# Altium footprint library HW_HOLLAND_NCDM_MONITOR_R1.PcbLib: 472 footprints (part 18 of 30)
Each footprint in its own frame and in the unit in brackets; x right, y up, seen from the top. Pads: shape width x height; smd on the part's side, far side on the other; paste and mask are expansions set on the pad; w line width, h text height; cw(c..) or ccw(c..) is an arc to the next point about the centre after c.
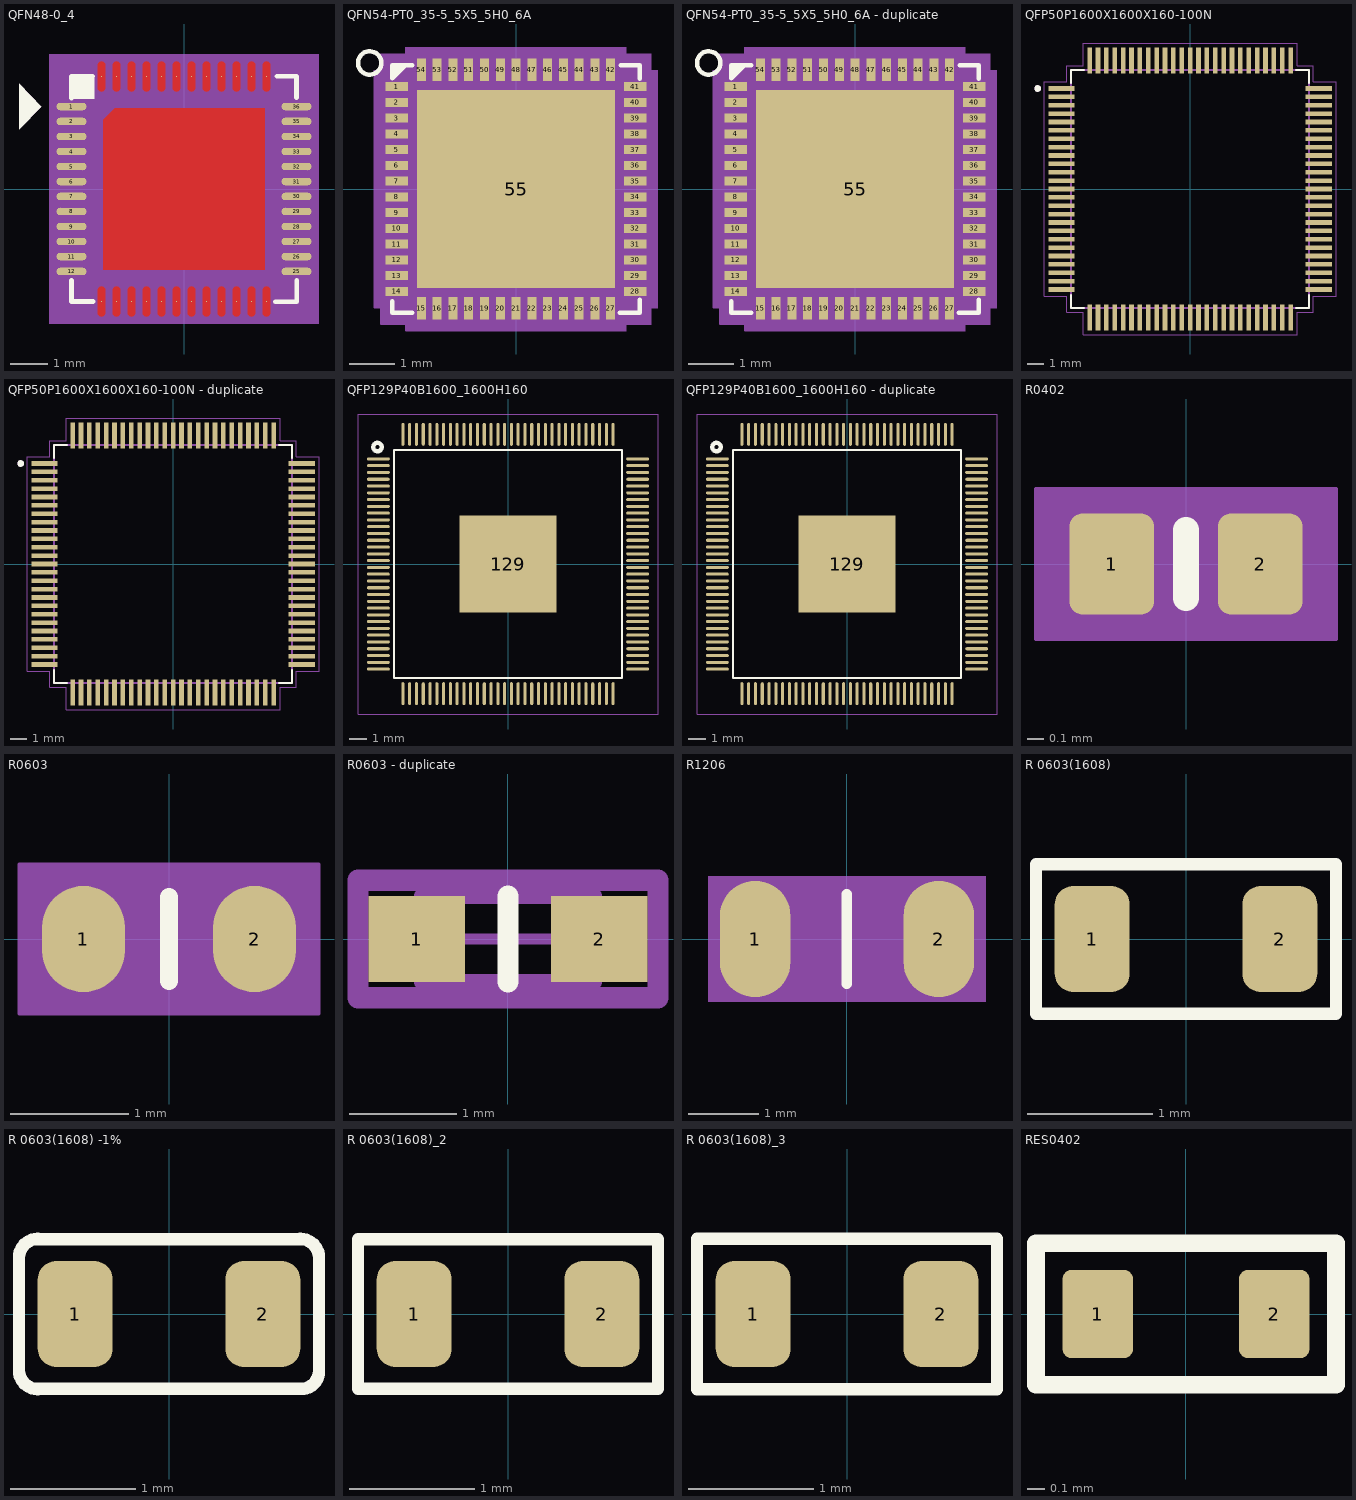
[diagram p17: the footprints below, top view; thin cyan lines are the x and y axes]

## QFN48-0_4 [mil]
pads (49):
  oval 31.5x7.87 smd: 1(-118.11,86.61) 2(-118.11,70.87) 3(-118.11,55.12) 4(-118.11,39.37) 5(-118.11,23.62) 6(-118.11,7.87) 7(-118.11,-7.87) 8(-118.11,-23.62) 9(-118.11,-39.37) 10(-118.11,-55.12) 11(-118.11,-70.87) 12(-118.11,-86.61) 25(118.11,-86.61) 26(118.11,-70.87) 27(118.11,-55.12) 28(118.11,-39.37) 29(118.11,-23.62) 30(118.11,-7.87) 31(118.11,7.87) 32(118.11,23.62) 33(118.11,39.37) 34(118.11,55.12) 35(118.11,70.87) 36(118.11,86.61)
  oct 1x1 smd: 13(-86.61,-118.11) 14(-70.87,-118.11) 15(-55.12,-118.11) 16(-39.37,-118.11) 17(-23.62,-118.11) 18(-7.87,-118.11) 19(7.87,-118.11) 20(23.62,-118.11) 21(39.37,-118.11) 22(55.12,-118.11) 23(70.87,-118.11) 24(86.61,-118.11) 37(86.61,118.11) 38(70.87,118.11) 39(55.12,118.11) 40(39.37,118.11) 41(23.62,118.11) 42(7.87,118.11) 43(-7.87,118.11) 44(-23.62,118.11) 45(-39.37,118.11) 46(-55.12,118.11) 47(-70.87,118.11) 48(-86.61,118.11) 49(-3.94,-3.94)
Top Layer:
  drawing of 26 lines, arcs and shapes, not listed
Top Overlay:
  dashed: -149.61,86.61 -173.23,62.99 -173.23,110.24
  dashed: -118.11,118.11 -118.11,94.49 -94.49,94.49 -94.49,118.11
  lines w4.92: -118.11,-95.67 -118.11,-118.11 -95.28,-118.11 ; -118.11,95.28 -118.11,118.5 ; -117.32,118.5 -96.06,118.5 ; 95.67,-118.5 118.5,-118.5 118.5,-95.67 ; 97.64,118.5 117.72,118.5 ; 118.11,95.67 118.11,118.11
Top Paste:
  drawing of 30 lines, arcs and shapes, not listed
Top Solder:
  drawing of 26 lines, arcs and shapes, not listed
Top Assembly:
  dashed: -149.61,86.61 -173.23,62.99 -173.23,110.24
  dashed: -118.11,118.11 -118.11,94.49 -94.49,94.49 -94.49,118.11
  lines w1: -118.11,-118.11 118.11,-118.11 118.11,118.11 -118.11,118.11 -118.11,-118.11
  text ".Designator" at -37.51,-8.33 h25
Top 3D Body:
  region: 141.73,141.73 141.73,-141.73 -141.73,-141.73 -141.73,141.73
Mechanical 17:
  text "34" at 118.11,83.92 h18
  text "14" at -70.87,-103.71 h18
  text "15" at -55.12,-103.71 h18
  text "13" at -86.61,-103.71 h18
  text "33" at 118.11,68.17 h18
  text "43" at -7.87,132.51 h18
  text "44" at -23.62,132.51 h18
  text "39" at 55.12,132.51 h18
  text "38" at 70.87,132.51 h18
  text "41" at 23.62,132.51 h18
  text "40" at 39.37,132.51 h18
  text "42" at 7.87,132.51 h18
  text "46" at -55.12,132.51 h18
  text "16" at -39.37,-103.71 h18
  text "26" at 118.11,-42.07 h18
  text "17" at -23.62,-103.71 h18
  text "28" at 118.11,-10.57 h18
  text "25" at 118.11,-57.81 h18
  text "32" at 118.11,52.42 h18
  text "19" at 7.87,-103.71 h18
  text "11" at -118.11,-42.07 h18
  text "10" at -118.11,-26.32 h18
  text "8" at -118.11,-9.22 h18
  text "7" at -118.11,6.53 h18
  text "6" at -118.11,22.27 h18
  text "5" at -118.11,38.02 h18
  text "3" at -118.11,69.52 h18
  text "2" at -118.11,85.27 h18
  text "27" at 118.11,-26.32 h18
  text "20" at 23.62,-103.71 h18
  text "29" at 118.11,5.18 h18
  text "4" at -118.11,53.77 h18
  text "9" at -118.11,-24.97 h18
  text "47" at -70.87,132.51 h18
  text "22" at 55.12,-103.71 h18
  text "12" at -118.11,-57.81 h18
  text "1" at -118.11,101.01 h18
  text "31" at 118.11,36.67 h18
  text "30" at 118.11,20.93 h18
  text "35" at 118.11,99.67 h18
  text "37" at 86.61,132.51 h18
  text "36" at 118.11,101.01 h18
  text "21" at 39.37,-103.71 h18
  text "24" at 86.61,-103.71 h18
  text "45" at -39.37,132.51 h18
  text "48" at -86.61,132.51 h18
  text "18" at -7.87,-103.71 h18
  text "23" at 70.87,-103.71 h18
  text "49" at -3.94,24.86 h18
3D body: height 150, standoff 0, extent -141.73,-141.73 141.73,141.73

## QFN54-PT0_35-5_5X5_5H0_6A [mm]
pads (55):
  rect 0.5x0.2 smd: 1(-2.65,2.275) 2(-2.65,1.925) 3(-2.65,1.575) 4(-2.65,1.225) 5(-2.65,0.875) 6(-2.65,0.525) 7(-2.65,0.175) 8(-2.65,-0.175) 9(-2.65,-0.525) 10(-2.65,-0.875) 11(-2.65,-1.225) 12(-2.65,-1.575) 13(-2.65,-1.925) 14(-2.65,-2.275) 28(2.65,-2.275) 29(2.65,-1.925) 30(2.65,-1.575) 31(2.65,-1.225) 32(2.65,-0.875) 33(2.65,-0.525) 34(2.65,-0.175) 35(2.65,0.175) 36(2.65,0.525) 37(2.65,0.875) 38(2.65,1.225) 39(2.65,1.575) 40(2.65,1.925) 41(2.65,2.275)
  rect 0.2x0.5 smd: 15(-2.1,-2.65) 16(-1.75,-2.65) 17(-1.4,-2.65) 18(-1.05,-2.65) 19(-0.7,-2.65) 20(-0.35,-2.65) 21(0,-2.65) 22(0.35,-2.65) 23(0.7,-2.65) 24(1.05,-2.65) 25(1.4,-2.65) 26(1.75,-2.65) 27(2.1,-2.65) 42(2.1,2.65) 43(1.75,2.65) 44(1.4,2.65) 45(1.05,2.65) 46(0.7,2.65) 47(0.35,2.65) 48(0,2.65) 49(-0.35,2.65) 50(-0.7,2.65) 51(-1.05,2.65) 52(-1.4,2.65) 53(-1.75,2.65) 54(-2.1,2.65)
  rect 4.4x4.4 smd: 55(0,0)
Top Overlay:
  circle w0.1: c-3.25,2.8 r0.26
  lines w0.1: -2.75,-2.49 -2.75,-2.75 -2.3,-2.75 ; -2.733,2.606 -2.603,2.737 ; -2.46,2.75 -2.75,2.46 -2.75,2.75 -2.3,2.75 ; 2.3,-2.75 2.75,-2.75 2.75,-2.46 ; 2.33,2.75 2.75,2.75 2.75,2.45
Top Assembly:
  lines w0.025: -2.9,-2.38 -2.75,-2.38 -2.75,-2.75 -2.2,-2.75 -2.2,-2.9 2.2,-2.9 2.2,-2.75 2.75,-2.75 2.75,-2.38 2.9,-2.38 2.9,2.38 2.75,2.38 2.75,2.75 2.2,2.75 2.2,2.9 -2.2,2.9 -2.2,2.75 -2.75,2.75 -2.75,2.38 -2.9,2.38 -2.9,-2.38
  text ".Designator" at -2.2,-0.2 h0.6
Mechanical 19:
  text "1" at -2.244,2.275 h0.51
  text "2" at -2.244,1.925 h0.51
  text "53" at -0.937,2.65 h0.51
  text "42" at 2.913,2.65 h0.51
  text "52" at -0.587,2.65 h0.51
  text "51" at -0.237,2.65 h0.51
  text "50" at 0.113,2.65 h0.51
  text "49" at 0.463,2.65 h0.51
  text "46" at 1.513,2.65 h0.51
  text "45" at 1.863,2.65 h0.51
  text "44" at 2.213,2.65 h0.51
  text "43" at 2.563,2.65 h0.51
  text "54" at -1.287,2.65 h0.51
  text "20" at 0.463,-2.65 h0.51
  text "55" at 0.813,0 h0.51
  text "27" at 2.913,-2.65 h0.51
  text "10" at -1.837,-0.875 h0.51
  text "18" at -0.237,-2.65 h0.51
  text "25" at 2.213,-2.65 h0.51
  text "32" at 3.463,-0.875 h0.51
  text "38" at 3.463,1.225 h0.51
  text "47" at 1.163,2.65 h0.51
  text "23" at 1.513,-2.65 h0.51
  text "34" at 3.463,-0.175 h0.51
  text "24" at 1.863,-2.65 h0.51
  text "13" at -1.837,-1.925 h0.51
  text "36" at 3.463,0.525 h0.51
  text "37" at 3.463,0.875 h0.51
  text "4" at -2.244,1.225 h0.51
  text "29" at 3.463,-1.925 h0.51
  text "5" at -2.244,0.875 h0.51
  text "21" at 0.813,-2.65 h0.51
  text "28" at 3.463,-2.275 h0.51
  text "6" at -2.244,0.525 h0.51
  text "12" at -1.837,-1.575 h0.51
  text "30" at 3.463,-1.575 h0.51
  text "35" at 3.463,0.175 h0.51
  text "41" at 3.463,2.275 h0.51
  text "3" at -2.244,1.575 h0.51
  text "15" at -1.287,-2.65 h0.51
  text "16" at -0.937,-2.65 h0.51
  text "17" at -0.587,-2.65 h0.51
  text "40" at 3.463,1.925 h0.51
  text "8" at -2.244,-0.175 h0.51
  text "14" at -1.837,-2.275 h0.51
  text "9" at -2.244,-0.525 h0.51
  text "11" at -1.837,-1.225 h0.51
  text "31" at 3.463,-1.225 h0.51
  text "7" at -2.244,0.175 h0.51
  text "19" at 0.113,-2.65 h0.51
  text "26" at 2.563,-2.65 h0.51
  text "33" at 3.463,-0.525 h0.51
  text "39" at 3.463,1.575 h0.51
  text "48" at 0.813,2.65 h0.51
  text "22" at 1.163,-2.65 h0.51
Mechanical 23:
  lines w0.025: -3.154,-2.634 -3.154,2.634 -3.004,2.634 -3.004,3.004 -2.454,3.004 -2.454,3.154 2.454,3.154 2.454,3.004 3.004,3.004 3.004,2.634 3.154,2.634 3.154,-2.634 3.004,-2.634 3.004,-3.004 2.454,-3.004 2.454,-3.154 -2.454,-3.154 -2.454,-3.004 -3.004,-3.004 -3.004,-2.634 -3.154,-2.634
Mechanical 24:
  dashed: -3.004,-2.634 -3.154,-2.634 -3.154,2.634 -3.004,2.634 -3.004,3.004 -2.454,3.004 -2.454,3.154 2.454,3.154 2.454,3.004 3.004,3.004 3.004,2.634 3.154,2.634 3.154,-2.634 3.004,-2.634 3.004,-3.004 2.454,-3.004 2.454,-3.154 -2.454,-3.154 -2.454,-3.004 -3.004,-3.004
3D body "QFN35P550X552X55_HS-55N.step": height 0.55, standoff 0, extent -2.795,-2.795 2.795,2.795

## QFN54-PT0_35-5_5X5_5H0_6A - duplicate [mm]
pads (55):
  rect 0.5x0.2 smd: 1(-2.65,2.275) 2(-2.65,1.925) 3(-2.65,1.575) 4(-2.65,1.225) 5(-2.65,0.875) 6(-2.65,0.525) 7(-2.65,0.175) 8(-2.65,-0.175) 9(-2.65,-0.525) 10(-2.65,-0.875) 11(-2.65,-1.225) 12(-2.65,-1.575) 13(-2.65,-1.925) 14(-2.65,-2.275) 28(2.65,-2.275) 29(2.65,-1.925) 30(2.65,-1.575) 31(2.65,-1.225) 32(2.65,-0.875) 33(2.65,-0.525) 34(2.65,-0.175) 35(2.65,0.175) 36(2.65,0.525) 37(2.65,0.875) 38(2.65,1.225) 39(2.65,1.575) 40(2.65,1.925) 41(2.65,2.275)
  rect 0.2x0.5 smd: 15(-2.1,-2.65) 16(-1.75,-2.65) 17(-1.4,-2.65) 18(-1.05,-2.65) 19(-0.7,-2.65) 20(-0.35,-2.65) 21(0,-2.65) 22(0.35,-2.65) 23(0.7,-2.65) 24(1.05,-2.65) 25(1.4,-2.65) 26(1.75,-2.65) 27(2.1,-2.65) 42(2.1,2.65) 43(1.75,2.65) 44(1.4,2.65) 45(1.05,2.65) 46(0.7,2.65) 47(0.35,2.65) 48(0,2.65) 49(-0.35,2.65) 50(-0.7,2.65) 51(-1.05,2.65) 52(-1.4,2.65) 53(-1.75,2.65) 54(-2.1,2.65)
  rect 4.4x4.4 smd: 55(0,0)
Top Overlay:
  circle w0.1: c-3.25,2.8 r0.26
  lines w0.1: -2.75,-2.49 -2.75,-2.75 -2.3,-2.75 ; -2.733,2.606 -2.603,2.737 ; -2.46,2.75 -2.75,2.46 -2.75,2.75 -2.3,2.75 ; 2.3,-2.75 2.75,-2.75 2.75,-2.46 ; 2.33,2.75 2.75,2.75 2.75,2.45
Top Assembly:
  lines w0.025: -2.9,-2.38 -2.75,-2.38 -2.75,-2.75 -2.2,-2.75 -2.2,-2.9 2.2,-2.9 2.2,-2.75 2.75,-2.75 2.75,-2.38 2.9,-2.38 2.9,2.38 2.75,2.38 2.75,2.75 2.2,2.75 2.2,2.9 -2.2,2.9 -2.2,2.75 -2.75,2.75 -2.75,2.38 -2.9,2.38 -2.9,-2.38
  text ".Designator" at -2.2,-0.2 h0.6
Mechanical 19:
  text "1" at -2.244,2.275 h0.51
  text "2" at -2.244,1.925 h0.51
  text "53" at -0.937,2.65 h0.51
  text "42" at 2.913,2.65 h0.51
  text "52" at -0.587,2.65 h0.51
  text "51" at -0.237,2.65 h0.51
  text "50" at 0.113,2.65 h0.51
  text "49" at 0.463,2.65 h0.51
  text "46" at 1.513,2.65 h0.51
  text "45" at 1.863,2.65 h0.51
  text "44" at 2.213,2.65 h0.51
  text "43" at 2.563,2.65 h0.51
  text "54" at -1.287,2.65 h0.51
  text "20" at 0.463,-2.65 h0.51
  text "55" at 0.813,0 h0.51
  text "27" at 2.913,-2.65 h0.51
  text "10" at -1.837,-0.875 h0.51
  text "18" at -0.237,-2.65 h0.51
  text "25" at 2.213,-2.65 h0.51
  text "32" at 3.463,-0.875 h0.51
  text "38" at 3.463,1.225 h0.51
  text "47" at 1.163,2.65 h0.51
  text "23" at 1.513,-2.65 h0.51
  text "34" at 3.463,-0.175 h0.51
  text "24" at 1.863,-2.65 h0.51
  text "13" at -1.837,-1.925 h0.51
  text "36" at 3.463,0.525 h0.51
  text "37" at 3.463,0.875 h0.51
  text "4" at -2.244,1.225 h0.51
  text "29" at 3.463,-1.925 h0.51
  text "5" at -2.244,0.875 h0.51
  text "21" at 0.813,-2.65 h0.51
  text "28" at 3.463,-2.275 h0.51
  text "6" at -2.244,0.525 h0.51
  text "12" at -1.837,-1.575 h0.51
  text "30" at 3.463,-1.575 h0.51
  text "35" at 3.463,0.175 h0.51
  text "41" at 3.463,2.275 h0.51
  text "3" at -2.244,1.575 h0.51
  text "15" at -1.287,-2.65 h0.51
  text "16" at -0.937,-2.65 h0.51
  text "17" at -0.587,-2.65 h0.51
  text "40" at 3.463,1.925 h0.51
  text "8" at -2.244,-0.175 h0.51
  text "14" at -1.837,-2.275 h0.51
  text "9" at -2.244,-0.525 h0.51
  text "11" at -1.837,-1.225 h0.51
  text "31" at 3.463,-1.225 h0.51
  text "7" at -2.244,0.175 h0.51
  text "19" at 0.113,-2.65 h0.51
  text "26" at 2.563,-2.65 h0.51
  text "33" at 3.463,-0.525 h0.51
  text "39" at 3.463,1.575 h0.51
  text "48" at 0.813,2.65 h0.51
  text "22" at 1.163,-2.65 h0.51
Mechanical 23:
  lines w0.025: -3.154,-2.634 -3.154,2.634 -3.004,2.634 -3.004,3.004 -2.454,3.004 -2.454,3.154 2.454,3.154 2.454,3.004 3.004,3.004 3.004,2.634 3.154,2.634 3.154,-2.634 3.004,-2.634 3.004,-3.004 2.454,-3.004 2.454,-3.154 -2.454,-3.154 -2.454,-3.004 -3.004,-3.004 -3.004,-2.634 -3.154,-2.634
Mechanical 24:
  dashed: -3.004,-2.634 -3.154,-2.634 -3.154,2.634 -3.004,2.634 -3.004,3.004 -2.454,3.004 -2.454,3.154 2.454,3.154 2.454,3.004 3.004,3.004 3.004,2.634 3.154,2.634 3.154,-2.634 3.004,-2.634 3.004,-3.004 2.454,-3.004 2.454,-3.154 -2.454,-3.154 -2.454,-3.004 -3.004,-3.004
3D body "QFN35P550X552X55_HS-55N.step": height 0.55, standoff 0, extent -2.795,-2.795 2.795,2.795

## QFP50P1600X1600X160-100N [mm]
pads (100):
  rrect7% 1.56x0.28 smd: 1(-7.68,6) 2(-7.68,5.5) 3(-7.68,5) 4(-7.68,4.5) 5(-7.68,4) 6(-7.68,3.5) 7(-7.68,3) 8(-7.68,2.5) 9(-7.68,2) 10(-7.68,1.5) 11(-7.68,1) 12(-7.68,0.5) 13(-7.68,0) 14(-7.68,-0.5) 15(-7.68,-1) 16(-7.68,-1.5) 17(-7.68,-2) 18(-7.68,-2.5) 19(-7.68,-3) 20(-7.68,-3.5) 21(-7.68,-4) 22(-7.68,-4.5) 23(-7.68,-5) 24(-7.68,-5.5) 25(-7.68,-6) 51(7.68,-6) 52(7.68,-5.5) 53(7.68,-5) 54(7.68,-4.5) 55(7.68,-4) 56(7.68,-3.5) 57(7.68,-3) 58(7.68,-2.5) 59(7.68,-2) 60(7.68,-1.5) 61(7.68,-1) 62(7.68,-0.5) 63(7.68,0) 64(7.68,0.5) 65(7.68,1) 66(7.68,1.5) 67(7.68,2) 68(7.68,2.5) 69(7.68,3) 70(7.68,3.5) 71(7.68,4) 72(7.68,4.5) 73(7.68,5) 74(7.68,5.5) 75(7.68,6)
  rrect7% 0.28x1.56 smd: 26(-6,-7.68) 27(-5.5,-7.68) 28(-5,-7.68) 29(-4.5,-7.68) 30(-4,-7.68) 31(-3.5,-7.68) 32(-3,-7.68) 33(-2.5,-7.68) 34(-2,-7.68) 35(-1.5,-7.68) 36(-1,-7.68) 37(-0.5,-7.68) 38(0,-7.68) 39(0.5,-7.68) 40(1,-7.68) 41(1.5,-7.68) 42(2,-7.68) 43(2.5,-7.68) 44(3,-7.68) 45(3.5,-7.68) 46(4,-7.68) 47(4.5,-7.68) 48(5,-7.68) 49(5.5,-7.68) 50(6,-7.68) 76(6,7.68) 77(5.5,7.68) 78(5,7.68) 79(4.5,7.68) 80(4,7.68) 81(3.5,7.68) 82(3,7.68) 83(2.5,7.68) 84(2,7.68) 85(1.5,7.68) 86(1,7.68) 87(0.5,7.68) 88(0,7.68) 89(-0.5,7.68) 90(-1,7.68) 91(-1.5,7.68) 92(-2,7.68) 93(-2.5,7.68) 94(-3,7.68) 95(-3.5,7.68) 96(-4,7.68) 97(-4.5,7.68) 98(-5,7.68) 99(-5.5,7.68) 100(-6,7.68)
Top Overlay:
  circle w0.2: c-9.1,6 r0.1
  lines w0.127: -7.1,-6.33 -7.1,-7.1 -6.33,-7.1 ; -7.1,6.33 -7.1,7.1 -6.33,7.1 ; 6.33,-7.1 7.1,-7.1 7.1,-6.33 ; 6.33,7.1 7.1,7.1 7.1,6.33
Mechanical 13:
  circle w0.2: c-9.1,6 r0.1
  lines w0.127: -7.1,-7.1 -7.1,7.1 7.1,7.1 7.1,-7.1 -7.1,-7.1
Mechanical 15:
  lines w0.05: -8.71,-6.39 -7.35,-6.39 -7.35,-7.35 -6.39,-7.35 -6.39,-8.71 6.39,-8.71 6.39,-7.35 7.35,-7.35 7.35,-6.39 8.71,-6.39 8.71,6.39 7.35,6.39 7.35,7.35 6.39,7.35 6.39,8.71 -6.39,8.71 -6.39,7.35 -7.35,7.35 -7.35,6.39 -8.71,6.39 -8.71,-6.39
3D body "step_temp.STEP": height 1.58, standoff -0.02, extent -8,-8 8,8

## QFP50P1600X1600X160-100N - duplicate [mm]
pads (100):
  rrect7% 1.56x0.28 smd: 1(-7.68,6) 2(-7.68,5.5) 3(-7.68,5) 4(-7.68,4.5) 5(-7.68,4) 6(-7.68,3.5) 7(-7.68,3) 8(-7.68,2.5) 9(-7.68,2) 10(-7.68,1.5) 11(-7.68,1) 12(-7.68,0.5) 13(-7.68,0) 14(-7.68,-0.5) 15(-7.68,-1) 16(-7.68,-1.5) 17(-7.68,-2) 18(-7.68,-2.5) 19(-7.68,-3) 20(-7.68,-3.5) 21(-7.68,-4) 22(-7.68,-4.5) 23(-7.68,-5) 24(-7.68,-5.5) 25(-7.68,-6) 51(7.68,-6) 52(7.68,-5.5) 53(7.68,-5) 54(7.68,-4.5) 55(7.68,-4) 56(7.68,-3.5) 57(7.68,-3) 58(7.68,-2.5) 59(7.68,-2) 60(7.68,-1.5) 61(7.68,-1) 62(7.68,-0.5) 63(7.68,0) 64(7.68,0.5) 65(7.68,1) 66(7.68,1.5) 67(7.68,2) 68(7.68,2.5) 69(7.68,3) 70(7.68,3.5) 71(7.68,4) 72(7.68,4.5) 73(7.68,5) 74(7.68,5.5) 75(7.68,6)
  rrect7% 0.28x1.56 smd: 26(-6,-7.68) 27(-5.5,-7.68) 28(-5,-7.68) 29(-4.5,-7.68) 30(-4,-7.68) 31(-3.5,-7.68) 32(-3,-7.68) 33(-2.5,-7.68) 34(-2,-7.68) 35(-1.5,-7.68) 36(-1,-7.68) 37(-0.5,-7.68) 38(0,-7.68) 39(0.5,-7.68) 40(1,-7.68) 41(1.5,-7.68) 42(2,-7.68) 43(2.5,-7.68) 44(3,-7.68) 45(3.5,-7.68) 46(4,-7.68) 47(4.5,-7.68) 48(5,-7.68) 49(5.5,-7.68) 50(6,-7.68) 76(6,7.68) 77(5.5,7.68) 78(5,7.68) 79(4.5,7.68) 80(4,7.68) 81(3.5,7.68) 82(3,7.68) 83(2.5,7.68) 84(2,7.68) 85(1.5,7.68) 86(1,7.68) 87(0.5,7.68) 88(0,7.68) 89(-0.5,7.68) 90(-1,7.68) 91(-1.5,7.68) 92(-2,7.68) 93(-2.5,7.68) 94(-3,7.68) 95(-3.5,7.68) 96(-4,7.68) 97(-4.5,7.68) 98(-5,7.68) 99(-5.5,7.68) 100(-6,7.68)
Top Overlay:
  circle w0.2: c-9.1,6 r0.1
  lines w0.127: -7.1,-6.33 -7.1,-7.1 -6.33,-7.1 ; -7.1,6.33 -7.1,7.1 -6.33,7.1 ; 6.33,-7.1 7.1,-7.1 7.1,-6.33 ; 6.33,7.1 7.1,7.1 7.1,6.33
Mechanical 13:
  circle w0.2: c-9.1,6 r0.1
  lines w0.127: -7.1,-7.1 -7.1,7.1 7.1,7.1 7.1,-7.1 -7.1,-7.1
Mechanical 15:
  lines w0.05: -8.71,-6.39 -7.35,-6.39 -7.35,-7.35 -6.39,-7.35 -6.39,-8.71 6.39,-8.71 6.39,-7.35 7.35,-7.35 7.35,-6.39 8.71,-6.39 8.71,6.39 7.35,6.39 7.35,7.35 6.39,7.35 6.39,8.71 -6.39,8.71 -6.39,7.35 -7.35,7.35 -7.35,6.39 -8.71,6.39 -8.71,-6.39
3D body "step_temp.STEP": height 1.58, standoff -0.02, extent -8,-8 8,8

## QFP129P40B1600_1600H160 [mm]
pads (129):
  oval 1.35x0.18 smd: 1(-7.65,6.2) 2(-7.65,5.8) 3(-7.65,5.4) 4(-7.65,5) 5(-7.65,4.6) 6(-7.65,4.2) 7(-7.65,3.8) 8(-7.65,3.4) 9(-7.65,3) 10(-7.65,2.6) 11(-7.65,2.2) 12(-7.65,1.8) 13(-7.65,1.4) 14(-7.65,1) 15(-7.65,0.6) 16(-7.65,0.2) 17(-7.65,-0.2) 18(-7.65,-0.6) 19(-7.65,-1) 20(-7.65,-1.4) 21(-7.65,-1.8) 22(-7.65,-2.2) 23(-7.65,-2.6) 24(-7.65,-3) 25(-7.65,-3.4) 26(-7.65,-3.8) 27(-7.65,-4.2) 28(-7.65,-4.6) 29(-7.65,-5) 30(-7.65,-5.4) 31(-7.65,-5.8) 32(-7.65,-6.2) 65(7.65,-6.2) 66(7.65,-5.8) 67(7.65,-5.4) 68(7.65,-5) 69(7.65,-4.6) 70(7.65,-4.2) 71(7.65,-3.8) 72(7.65,-3.4) 73(7.65,-3) 74(7.65,-2.6) 75(7.65,-2.2) 76(7.65,-1.8) 77(7.65,-1.4) 78(7.65,-1) 79(7.65,-0.6) 80(7.65,-0.2) 81(7.65,0.2) 82(7.65,0.6) 83(7.65,1) 84(7.65,1.4) 85(7.65,1.8) 86(7.65,2.2) 87(7.65,2.6) 88(7.65,3) 89(7.65,3.4) 90(7.65,3.8) 91(7.65,4.2) 92(7.65,4.6) 93(7.65,5) 94(7.65,5.4) 95(7.65,5.8) 96(7.65,6.2)
  oval 0.18x1.35 smd: 33(-6.2,-7.65) 34(-5.8,-7.65) 35(-5.4,-7.65) 36(-5,-7.65) 37(-4.6,-7.65) 38(-4.2,-7.65) 39(-3.8,-7.65) 40(-3.4,-7.65) 41(-3,-7.65) 42(-2.6,-7.65) 43(-2.2,-7.65) 44(-1.8,-7.65) 45(-1.4,-7.65) 46(-1,-7.65) 47(-0.6,-7.65) 48(-0.2,-7.65) 49(0.2,-7.65) 50(0.6,-7.65) 51(1,-7.65) 52(1.4,-7.65) 53(1.8,-7.65) 54(2.2,-7.65) 55(2.6,-7.65) 56(3,-7.65) 57(3.4,-7.65) 58(3.8,-7.65) 59(4.2,-7.65) 60(4.6,-7.65) 61(5,-7.65) 62(5.4,-7.65) 63(5.8,-7.65) 64(6.2,-7.65) 97(6.2,7.65) 98(5.8,7.65) 99(5.4,7.65) 100(5,7.65) 101(4.6,7.65) 102(4.2,7.65) 103(3.8,7.65) 104(3.4,7.65) 105(3,7.65) 106(2.6,7.65) 107(2.2,7.65) 108(1.8,7.65) 109(1.4,7.65) 110(1,7.65) 111(0.6,7.65) 112(0.2,7.65) 113(-0.2,7.65) 114(-0.6,7.65) 115(-1,7.65) 116(-1.4,7.65) 117(-1.8,7.65) 118(-2.2,7.65) 119(-2.6,7.65) 120(-3,7.65) 121(-3.4,7.65) 122(-3.8,7.65) 123(-4.2,7.65) 124(-4.6,7.65) 125(-5,7.65) 126(-5.4,7.65) 127(-5.8,7.65) 128(-6.2,7.65)
  rect 5.72x5.72 smd: 129(0,0)
Top Overlay:
  circle w0.25: c-7.7,6.9 r0.25
  lines w0.1: -6.731,-6.731 -6.731,6.731 6.731,6.731 6.731,-6.731 -6.731,-6.731
Top Paste:
  region: -2.2,-1.3 -1.35,-1.3 -1.35,-1.1 -2.2,-1.1 -2.2,-0.1 -1.35,-0.1 -1.35,0.1 -2.15,0.1 -2.2,0.1 -2.2,1.1 -2.15,1.1 -1.35,1.1 -1.35,1.3 -2.2,1.3 -2.2,2.2 -1.3,2.2 -1.3,1.35 -1.1,1.35 -1.1,2.2 -0.1,2.2 -0.1,1.35 0.1,1.35 0.1,2.2 1.1,2.2 1.1,1.35 1.3,1.35 1.3,2.2 2.2,2.2 2.2,1.3 -1.3,1.3 -1.3,0.15 -1.1,0.15 -1.1,1.1 -0.1,1.1 -0.1,0.15 0.1,0.15 0.1,1.1 1.1,1.1 1.1,0.15 1.3,0.15 1.3,1.1 2.2,1.1 2.2,0.1 -1.3,0.1 -1.3,-1.05 -1.1,-1.05 -1.1,-0.1 -0.1,-0.1 -0.1,-1.05 0.1,-1.05 0.1,-0.1 1.1,-0.1 1.1,-1.05 1.3,-1.05 1.3,-0.1 2.2,-0.1 2.2,-1.1 -1.3,-1.1 -1.3,-2.15 -1.1,-2.15 -1.1,-1.3 -0.1,-1.3 -0.1,-2.15 0.1,-2.15 0.1,-1.3 1.1,-1.3 1.1,-2.1 1.1,-2.15 1.3,-2.15 1.3,-2.1 1.3,-1.3 2.2,-1.3 2.2,-2.2 0.4,-2.2 -2.2,-2.2
Top Assembly:
  lines w0.025: -8.85,-8.85 -8.85,8.85 8.85,8.85 8.85,6.565 8.85,-8.85 -8.85,-8.85
Mechanical 16:
  text "129" at -0.083,0.345 h0.3
  text "100" at 5.2,8.01 h0.3
  text "87" at 7.65,2.64 h0.3
  text "98" at 6,7.89 h0.3
  text "21" at -7.65,-1.76 h0.3
  text "50" at 0.8,-7.41 h0.3
  text "93" at 7.65,5.04 h0.3
  text "95" at 7.65,5.84 h0.3
  text "28" at -7.65,-4.56 h0.3
  text "88" at 7.65,3.04 h0.3
  text "107" at 2.4,8.01 h0.3
  text "27" at -7.65,-4.16 h0.3
  text "47" at -0.4,-7.41 h0.3
  text "90" at 7.65,3.84 h0.3
  text "22" at -7.65,-2.16 h0.3
  text "111" at 0.8,8.01 h0.3
  text "92" at 7.65,4.64 h0.3
  text "24" at -7.65,-2.96 h0.3
  text "89" at 7.65,3.44 h0.3
  text "110" at 1.2,8.01 h0.3
  text "25" at -7.65,-3.36 h0.3
  text "91" at 7.65,4.24 h0.3
  text "26" at -7.65,-3.76 h0.3
  text "23" at -7.65,-2.56 h0.3
  text "30" at -7.65,-5.36 h0.3
  text "9" at -7.65,2.92 h0.3
  text "7" at -7.65,3.72 h0.3
  text "12" at -7.65,1.84 h0.3
  text "13" at -7.65,1.44 h0.3
  text "10" at -7.65,2.64 h0.3
  text "11" at -7.65,2.24 h0.3
  text "8" at -7.65,3.32 h0.3
  text "19" at -7.65,-0.96 h0.3
  text "34" at -5.6,-7.41 h0.3
  text "66" at 7.65,-5.76 h0.3
  text "77" at 7.65,-1.36 h0.3
  text "102" at 4.4,8.01 h0.3
  text "103" at 4,8.01 h0.3
  text "104" at 3.6,8.01 h0.3
  text "105" at 3.2,8.01 h0.3
  text "113" at 0,8.01 h0.3
  text "114" at -0.4,8.01 h0.3
  text "112" at 0.4,8.01 h0.3
  text "115" at -0.8,8.01 h0.3
  text "81" at 7.65,0.24 h0.3
  text "116" at -1.2,8.01 h0.3
  text "117" at -1.6,8.01 h0.3
  text "46" at -0.8,-7.41 h0.3
  text "51" at 1.2,-7.41 h0.3
  text "20" at -7.65,-1.36 h0.3
  text "128" at -6,8.01 h0.3
  text "83" at 7.65,1.04 h0.3
  text "29" at -7.65,-4.96 h0.3
  text "65" at 7.65,-6.16 h0.3
  text "97" at 6.4,7.89 h0.3
  text "48" at 0,-7.41 h0.3
  text "49" at 0.4,-7.41 h0.3
  text "101" at 4.8,8.01 h0.3
  text "78" at 7.65,-0.96 h0.3
  text "99" at 5.6,7.89 h0.3
  text "94" at 7.65,5.44 h0.3
  text "96" at 7.65,6.24 h0.3
  text "38" at -4,-7.41 h0.3
  text "39" at -3.6,-7.41 h0.3
  text "106" at 2.8,8.01 h0.3
  text "80" at 7.65,-0.16 h0.3
  text "79" at 7.65,-0.56 h0.3
  text "84" at 7.65,1.44 h0.3
  text "82" at 7.65,0.64 h0.3
  text "6" at -7.65,4.12 h0.3
  text "33" at -6,-7.41 h0.3
  text "35" at -5.2,-7.41 h0.3
  text "36" at -4.8,-7.41 h0.3
  text "37" at -4.4,-7.41 h0.3
  text "40" at -3.2,-7.41 h0.3
  text "41" at -2.8,-7.41 h0.3
  text "42" at -2.4,-7.41 h0.3
  text "43" at -2,-7.41 h0.3
  text "108" at 2,8.01 h0.3
  text "109" at 1.6,8.01 h0.3
  text "18" at -7.65,-0.56 h0.3
  text "71" at 7.65,-3.76 h0.3
  text "69" at 7.65,-4.56 h0.3
  text "17" at -7.65,-0.16 h0.3
  text "70" at 7.65,-4.16 h0.3
  text "16" at -7.65,0.24 h0.3
  text "15" at -7.65,0.64 h0.3
  text "55" at 2.8,-7.41 h0.3
  text "56" at 3.2,-7.41 h0.3
  text "14" at -7.65,1.04 h0.3
  text "57" at 3.6,-7.41 h0.3
  text "58" at 4,-7.41 h0.3
  text "59" at 4.4,-7.41 h0.3
  text "60" at 4.8,-7.41 h0.3
  text "61" at 5.2,-7.41 h0.3
  text "62" at 5.6,-7.41 h0.3
  text "63" at 6,-7.41 h0.3
  text "64" at 6.4,-7.41 h0.3
  text "67" at 7.65,-5.36 h0.3
  text "68" at 7.65,-4.96 h0.3
  text "72" at 7.65,-3.36 h0.3
  text "73" at 7.65,-2.96 h0.3
  text "74" at 7.65,-2.56 h0.3
  text "75" at 7.65,-2.16 h0.3
  text "76" at 7.65,-1.76 h0.3
  text "44" at -1.6,-7.41 h0.3
  text "54" at 2.4,-7.41 h0.3
  text "45" at -1.2,-7.41 h0.3
  text "53" at 2,-7.41 h0.3
  text "52" at 1.6,-7.41 h0.3
  text "32" at -7.65,-6.16 h0.3
  text "31" at -7.65,-5.76 h0.3
  text "120" at -2.8,8.01 h0.3
  text "118" at -2,8.01 h0.3
  text "119" at -2.4,8.01 h0.3
  text "121" at -3.2,8.01 h0.3
  text "123" at -4,8.01 h0.3
  text "122" at -3.6,8.01 h0.3
  text "1" at -7.65,6.12 h0.3
  text "2" at -7.65,5.72 h0.3
  text "3" at -7.65,5.32 h0.3
  text "5" at -7.65,4.52 h0.3
  text "124" at -4.4,8.01 h0.3
  text "125" at -4.8,8.01 h0.3
  text "126" at -5.2,8.01 h0.3
  text "127" at -5.6,8.01 h0.3
  text "4" at -7.65,4.92 h0.3
  text "86" at 7.65,2.24 h0.3
  text "85" at 7.65,1.84 h0.3
3D body "User Library-IPC QFP-full (1).step": height 1.75, standoff 0, extent -8.011,-8.011 8.011,8.011

## QFP129P40B1600_1600H160 - duplicate [mm]
pads (129):
  oval 1.35x0.18 smd: 1(-7.65,6.2) 2(-7.65,5.8) 3(-7.65,5.4) 4(-7.65,5) 5(-7.65,4.6) 6(-7.65,4.2) 7(-7.65,3.8) 8(-7.65,3.4) 9(-7.65,3) 10(-7.65,2.6) 11(-7.65,2.2) 12(-7.65,1.8) 13(-7.65,1.4) 14(-7.65,1) 15(-7.65,0.6) 16(-7.65,0.2) 17(-7.65,-0.2) 18(-7.65,-0.6) 19(-7.65,-1) 20(-7.65,-1.4) 21(-7.65,-1.8) 22(-7.65,-2.2) 23(-7.65,-2.6) 24(-7.65,-3) 25(-7.65,-3.4) 26(-7.65,-3.8) 27(-7.65,-4.2) 28(-7.65,-4.6) 29(-7.65,-5) 30(-7.65,-5.4) 31(-7.65,-5.8) 32(-7.65,-6.2) 65(7.65,-6.2) 66(7.65,-5.8) 67(7.65,-5.4) 68(7.65,-5) 69(7.65,-4.6) 70(7.65,-4.2) 71(7.65,-3.8) 72(7.65,-3.4) 73(7.65,-3) 74(7.65,-2.6) 75(7.65,-2.2) 76(7.65,-1.8) 77(7.65,-1.4) 78(7.65,-1) 79(7.65,-0.6) 80(7.65,-0.2) 81(7.65,0.2) 82(7.65,0.6) 83(7.65,1) 84(7.65,1.4) 85(7.65,1.8) 86(7.65,2.2) 87(7.65,2.6) 88(7.65,3) 89(7.65,3.4) 90(7.65,3.8) 91(7.65,4.2) 92(7.65,4.6) 93(7.65,5) 94(7.65,5.4) 95(7.65,5.8) 96(7.65,6.2)
  oval 0.18x1.35 smd: 33(-6.2,-7.65) 34(-5.8,-7.65) 35(-5.4,-7.65) 36(-5,-7.65) 37(-4.6,-7.65) 38(-4.2,-7.65) 39(-3.8,-7.65) 40(-3.4,-7.65) 41(-3,-7.65) 42(-2.6,-7.65) 43(-2.2,-7.65) 44(-1.8,-7.65) 45(-1.4,-7.65) 46(-1,-7.65) 47(-0.6,-7.65) 48(-0.2,-7.65) 49(0.2,-7.65) 50(0.6,-7.65) 51(1,-7.65) 52(1.4,-7.65) 53(1.8,-7.65) 54(2.2,-7.65) 55(2.6,-7.65) 56(3,-7.65) 57(3.4,-7.65) 58(3.8,-7.65) 59(4.2,-7.65) 60(4.6,-7.65) 61(5,-7.65) 62(5.4,-7.65) 63(5.8,-7.65) 64(6.2,-7.65) 97(6.2,7.65) 98(5.8,7.65) 99(5.4,7.65) 100(5,7.65) 101(4.6,7.65) 102(4.2,7.65) 103(3.8,7.65) 104(3.4,7.65) 105(3,7.65) 106(2.6,7.65) 107(2.2,7.65) 108(1.8,7.65) 109(1.4,7.65) 110(1,7.65) 111(0.6,7.65) 112(0.2,7.65) 113(-0.2,7.65) 114(-0.6,7.65) 115(-1,7.65) 116(-1.4,7.65) 117(-1.8,7.65) 118(-2.2,7.65) 119(-2.6,7.65) 120(-3,7.65) 121(-3.4,7.65) 122(-3.8,7.65) 123(-4.2,7.65) 124(-4.6,7.65) 125(-5,7.65) 126(-5.4,7.65) 127(-5.8,7.65) 128(-6.2,7.65)
  rect 5.72x5.72 smd: 129(0,0)
Top Overlay:
  circle w0.25: c-7.7,6.9 r0.25
  lines w0.1: -6.731,-6.731 -6.731,6.731 6.731,6.731 6.731,-6.731 -6.731,-6.731
Top Paste:
  region: -2.2,-1.3 -1.35,-1.3 -1.35,-1.1 -2.2,-1.1 -2.2,-0.1 -1.35,-0.1 -1.35,0.1 -2.15,0.1 -2.2,0.1 -2.2,1.1 -2.15,1.1 -1.35,1.1 -1.35,1.3 -2.2,1.3 -2.2,2.2 -1.3,2.2 -1.3,1.35 -1.1,1.35 -1.1,2.2 -0.1,2.2 -0.1,1.35 0.1,1.35 0.1,2.2 1.1,2.2 1.1,1.35 1.3,1.35 1.3,2.2 2.2,2.2 2.2,1.3 -1.3,1.3 -1.3,0.15 -1.1,0.15 -1.1,1.1 -0.1,1.1 -0.1,0.15 0.1,0.15 0.1,1.1 1.1,1.1 1.1,0.15 1.3,0.15 1.3,1.1 2.2,1.1 2.2,0.1 -1.3,0.1 -1.3,-1.05 -1.1,-1.05 -1.1,-0.1 -0.1,-0.1 -0.1,-1.05 0.1,-1.05 0.1,-0.1 1.1,-0.1 1.1,-1.05 1.3,-1.05 1.3,-0.1 2.2,-0.1 2.2,-1.1 -1.3,-1.1 -1.3,-2.15 -1.1,-2.15 -1.1,-1.3 -0.1,-1.3 -0.1,-2.15 0.1,-2.15 0.1,-1.3 1.1,-1.3 1.1,-2.1 1.1,-2.15 1.3,-2.15 1.3,-2.1 1.3,-1.3 2.2,-1.3 2.2,-2.2 0.4,-2.2 -2.2,-2.2
Top Assembly:
  lines w0.025: -8.85,-8.85 -8.85,8.85 8.85,8.85 8.85,6.565 8.85,-8.85 -8.85,-8.85
Mechanical 16:
  text "129" at -0.083,0.345 h0.3
  text "100" at 5.2,8.01 h0.3
  text "87" at 7.65,2.64 h0.3
  text "98" at 6,7.89 h0.3
  text "21" at -7.65,-1.76 h0.3
  text "50" at 0.8,-7.41 h0.3
  text "93" at 7.65,5.04 h0.3
  text "95" at 7.65,5.84 h0.3
  text "28" at -7.65,-4.56 h0.3
  text "88" at 7.65,3.04 h0.3
  text "107" at 2.4,8.01 h0.3
  text "27" at -7.65,-4.16 h0.3
  text "47" at -0.4,-7.41 h0.3
  text "90" at 7.65,3.84 h0.3
  text "22" at -7.65,-2.16 h0.3
  text "111" at 0.8,8.01 h0.3
  text "92" at 7.65,4.64 h0.3
  text "24" at -7.65,-2.96 h0.3
  text "89" at 7.65,3.44 h0.3
  text "110" at 1.2,8.01 h0.3
  text "25" at -7.65,-3.36 h0.3
  text "91" at 7.65,4.24 h0.3
  text "26" at -7.65,-3.76 h0.3
  text "23" at -7.65,-2.56 h0.3
  text "30" at -7.65,-5.36 h0.3
  text "9" at -7.65,2.92 h0.3
  text "7" at -7.65,3.72 h0.3
  text "12" at -7.65,1.84 h0.3
  text "13" at -7.65,1.44 h0.3
  text "10" at -7.65,2.64 h0.3
  text "11" at -7.65,2.24 h0.3
  text "8" at -7.65,3.32 h0.3
  text "19" at -7.65,-0.96 h0.3
  text "34" at -5.6,-7.41 h0.3
  text "66" at 7.65,-5.76 h0.3
  text "77" at 7.65,-1.36 h0.3
  text "102" at 4.4,8.01 h0.3
  text "103" at 4,8.01 h0.3
  text "104" at 3.6,8.01 h0.3
  text "105" at 3.2,8.01 h0.3
  text "113" at 0,8.01 h0.3
  text "114" at -0.4,8.01 h0.3
  text "112" at 0.4,8.01 h0.3
  text "115" at -0.8,8.01 h0.3
  text "81" at 7.65,0.24 h0.3
  text "116" at -1.2,8.01 h0.3
  text "117" at -1.6,8.01 h0.3
  text "46" at -0.8,-7.41 h0.3
  text "51" at 1.2,-7.41 h0.3
  text "20" at -7.65,-1.36 h0.3
  text "128" at -6,8.01 h0.3
  text "83" at 7.65,1.04 h0.3
  text "29" at -7.65,-4.96 h0.3
  text "65" at 7.65,-6.16 h0.3
  text "97" at 6.4,7.89 h0.3
  text "48" at 0,-7.41 h0.3
  text "49" at 0.4,-7.41 h0.3
  text "101" at 4.8,8.01 h0.3
  text "78" at 7.65,-0.96 h0.3
  text "99" at 5.6,7.89 h0.3
  text "94" at 7.65,5.44 h0.3
  text "96" at 7.65,6.24 h0.3
  text "38" at -4,-7.41 h0.3
  text "39" at -3.6,-7.41 h0.3
  text "106" at 2.8,8.01 h0.3
  text "80" at 7.65,-0.16 h0.3
  text "79" at 7.65,-0.56 h0.3
  text "84" at 7.65,1.44 h0.3
  text "82" at 7.65,0.64 h0.3
  text "6" at -7.65,4.12 h0.3
  text "33" at -6,-7.41 h0.3
  text "35" at -5.2,-7.41 h0.3
  text "36" at -4.8,-7.41 h0.3
  text "37" at -4.4,-7.41 h0.3
  text "40" at -3.2,-7.41 h0.3
  text "41" at -2.8,-7.41 h0.3
  text "42" at -2.4,-7.41 h0.3
  text "43" at -2,-7.41 h0.3
  text "108" at 2,8.01 h0.3
  text "109" at 1.6,8.01 h0.3
  text "18" at -7.65,-0.56 h0.3
  text "71" at 7.65,-3.76 h0.3
  text "69" at 7.65,-4.56 h0.3
  text "17" at -7.65,-0.16 h0.3
  text "70" at 7.65,-4.16 h0.3
  text "16" at -7.65,0.24 h0.3
  text "15" at -7.65,0.64 h0.3
  text "55" at 2.8,-7.41 h0.3
  text "56" at 3.2,-7.41 h0.3
  text "14" at -7.65,1.04 h0.3
  text "57" at 3.6,-7.41 h0.3
  text "58" at 4,-7.41 h0.3
  text "59" at 4.4,-7.41 h0.3
  text "60" at 4.8,-7.41 h0.3
  text "61" at 5.2,-7.41 h0.3
  text "62" at 5.6,-7.41 h0.3
  text "63" at 6,-7.41 h0.3
  text "64" at 6.4,-7.41 h0.3
  text "67" at 7.65,-5.36 h0.3
  text "68" at 7.65,-4.96 h0.3
  text "72" at 7.65,-3.36 h0.3
  text "73" at 7.65,-2.96 h0.3
  text "74" at 7.65,-2.56 h0.3
  text "75" at 7.65,-2.16 h0.3
  text "76" at 7.65,-1.76 h0.3
  text "44" at -1.6,-7.41 h0.3
  text "54" at 2.4,-7.41 h0.3
  text "45" at -1.2,-7.41 h0.3
  text "53" at 2,-7.41 h0.3
  text "52" at 1.6,-7.41 h0.3
  text "32" at -7.65,-6.16 h0.3
  text "31" at -7.65,-5.76 h0.3
  text "120" at -2.8,8.01 h0.3
  text "118" at -2,8.01 h0.3
  text "119" at -2.4,8.01 h0.3
  text "121" at -3.2,8.01 h0.3
  text "123" at -4,8.01 h0.3
  text "122" at -3.6,8.01 h0.3
  text "1" at -7.65,6.12 h0.3
  text "2" at -7.65,5.72 h0.3
  text "3" at -7.65,5.32 h0.3
  text "5" at -7.65,4.52 h0.3
  text "124" at -4.4,8.01 h0.3
  text "125" at -4.8,8.01 h0.3
  text "126" at -5.2,8.01 h0.3
  text "127" at -5.6,8.01 h0.3
  text "4" at -7.65,4.92 h0.3
  text "86" at 7.65,2.24 h0.3
  text "85" at 7.65,1.84 h0.3
3D body "User Library-IPC QFP-full (1).step": height 1.75, standoff 0, extent -8.011,-8.011 8.011,8.011

## R0402 [mm]
pads (2):
  rrect30% 0.499x0.6 smd: 1(-0.44,0) 2(0.44,0)
Top Overlay:
  lines w0.152: 0,-0.203 0,0.203
  text ".Designator" at 0.953,0.212 h0.64
Top Assembly:
  lines w0.025: 0,-0.279 0,-0.152 ; 0,0.152 0,0.279 ; -0.889,-0.445 0.889,-0.445 0.889,0.445 -0.889,0.445 -0.889,-0.445 ; -0.051,-0.152 0.051,-0.152 0.051,0.152 -0.051,0.152 -0.051,-0.152
Top 3D Body:
  region: -0.889,0.445 -0.889,-0.445 0.889,-0.445 0.889,0.445
Top Component Outline:
  lines w0.025: 0.25,-0.25 0.25,0.25 -0.25,0.25 -0.25,-0.25 -0.5,-0.25 ; -0.5,-0.25 -0.5,0.25 ; -0.5,-0.25 0.5,-0.25 0.5,0.25 -0.5,0.25 ; -0.5,-0.25 -0.5,0.25
Mechanical 17:
  text "1" at -0.074,0 h0.46
  text "2" at 0.806,0 h0.46
3D body: height 3.81, standoff 0, extent -0.889,-0.445 0.889,0.445

## R0603 [mm]
pads (2):
  oval 0.7x0.9 smd: 1(-0.724,0) 2(0.724,0)
Top Overlay:
  lines w0.152: 0,-0.356 0,0.356
Top Assembly:
  lines w0.025: 0,-0.508 0,-0.229 ; 0,0.229 0,0.508 ; -1.27,-0.635 -1.27,0.635 1.27,0.635 1.27,-0.635 -1.27,-0.635 ; -0.102,-0.229 0.102,-0.229 0.102,0.229 -0.102,0.229 -0.102,-0.229
  text ".Designator" at 0.953,0.212 h0.64
Top 3D Body:
  region: -1.27,0.635 -1.27,-0.635 1.27,-0.635 1.27,0.635
Top Component Outline:
  lines w0.025: -0.5,-0.4 -0.8,-0.4 -0.8,0.4 -0.5,0.4 ; -0.5,-0.4 -0.5,0.4 ; -0.5,-0.4 0.5,-0.4 ; -0.5,0.4 0.5,0.4 ; 0.5,-0.4 0.5,0.4 ; 0.5,-0.4 0.8,-0.4 0.8,0.4 0.5,0.4
Mechanical 17:
  text "2" at 0.889,0.848 h1.22
  text "1" at -0.572,0.848 h1.22
3D body: height 3.81, standoff 0, extent -1.27,-0.635 1.27,0.635

## R0603 - duplicate [mm]
pads (2):
  rect 0.9x0.8 smd paste+0 mask+0: 1(-0.85,0) 2(0.85,0)
Top Overlay:
  lines w0.2: 0,-0.4 0,0.4
Top Courtyard:
  lines w0.2: -1.4,-0.55 -1.4,0.55 1.4,0.55 1.4,-0.55 -1.4,-0.55
  text ".Designator" at 0,0 h1.25
Mechanical 12:
  lines w0.15: -0.8,-0.4 -0.8,0.4 0.8,0.4 0.8,-0.4 -0.8,-0.4
Mechanical 15:
  lines w0.1: -0.5,0 0.5,0 ; 0,-0.5 0,0.5
  lines w0.2: -1.4,-0.55 -1.4,0.55 1.4,0.55 1.4,-0.55 -1.4,-0.55
3D body "3dmodel.step": height 0.25, standoff 0, extent -1.4,-0.55 1.4,0.55

## R1206 [mm]
pads (2):
  oval 1x1.65 smd: 1(-1.3,0) 2(1.3,0)
Top Overlay:
  lines w0.152: -0.003,-0.635 -0.003,0.635
Top Assembly:
  lines w0.025: 0,-0.686 0,-0.381 ; 0,0.381 0,0.686 ; -0.152,-0.381 0.152,-0.381 0.152,0.381 -0.152,0.381 -0.152,-0.381
  text ".Designator" at -1.271,-0.212 h0.64
Top 3D Body:
  region: -1.968,0.889 1.968,0.889 1.968,-0.889 -1.968,-0.889
Top Component Outline:
  lines w0.025: -1.06,0.8 -1.6,0.8 -1.6,-0.8 -1.1,-0.8 ; -1.1,-0.8 -1.1,0.8 1.1,0.8 ; -1.1,-0.8 1.1,-0.8 ; 1.1,-0.8 1.1,0.8 ; 1.1,-0.8 1.6,-0.8 1.6,0.8 1.1,0.8
Mechanical 17:
  text "1" at -1.143,-0.897 h1.04
  text "2" at 1.46,-0.897 h1.04
3D body: height 3.81, standoff 0, extent -1.968,-0.889 1.968,0.889

## R 0603(1608) [mm]
height 0.45
pads (2):
  rrect50% 0.6x0.85 smd: 1(-0.75,0) 2(0.75,0)
Top Overlay:
  lines w0.1: -1.2,-0.6 1.2,-0.6 1.2,0.6 -1.2,0.6 -1.2,-0.6
3D body "SMD R-0603.STEP": height 0.45, standoff -0.01, extent -0.8,-0.4 0.8,0.4

## R 0603(1608) -1% [mm]
height 3.5
pads (2):
  rrect50% 0.6x0.85 smd: 1(-0.75,0) 2(0.75,0)
Top Overlay:
  lines w0.1: -1.2,-0.45 ccw(c-1.05,-0.45) -1.05,-0.6 1.055,-0.6 ccw(c1.055,-0.455) 1.2,-0.455 1.2,0.45 ccw(c1.05,0.45) 1.05,0.6 -1.05,0.6 ccw(c-1.05,0.45) -1.2,0.45 -1.2,-0.45
3D body "SMD R-0603-1%.STEP": height 0.45, standoff -0.01, extent -0.8,-0.4 0.8,0.4

## R 0603(1608)_2 [mm]
pads (2):
  rrect50% 0.6x0.85 smd: 1(-0.75,0) 2(0.75,0)
Top Overlay:
  lines w0.1: -1.2,-0.6 1.2,-0.6 1.2,0.6 -1.2,0.6 -1.2,-0.6
3D body "SMD R-0603.STEP": height 0.45, standoff -0.01, extent -0.8,-0.4 0.8,0.4

## R 0603(1608)_3 [mm]
pads (2):
  rrect50% 0.6x0.85 smd: 1(-0.75,0) 2(0.75,0)
Top Overlay:
  lines w0.1: -1.2,-0.6 -1.2,0.6 1.2,0.6 1.2,-0.6 -1.2,-0.6
3D body "SMD R-0603.STEP": height 0.45, standoff -0.01, extent -0.8,-0.4 0.8,0.4

## RES0402 [mm]
pads (2):
  rrect25% 0.4x0.5 smd mask+0.102: 1(-0.5,0) 2(0.5,0)
Top Overlay:
  lines w0.1: -0.85,-0.4 0.85,-0.4 0.85,0.4 -0.85,0.4 -0.85,-0.4
3D body "SMD R-0402.STEP": height 0.35, standoff 0, extent -0.5,-0.25 0.5,0.25